# Altium footprint library MainFPs.PcbLib: 215 footprints (part 7 of 14)
Each footprint in its own frame and in the unit in brackets; x right, y up, seen from the top. Pads: shape width x height; smd on the part's side, far side on the other; paste and mask are expansions set on the pad; w line width, h text height; cw(c..) or ccw(c..) is an arc to the next point about the centre after c.
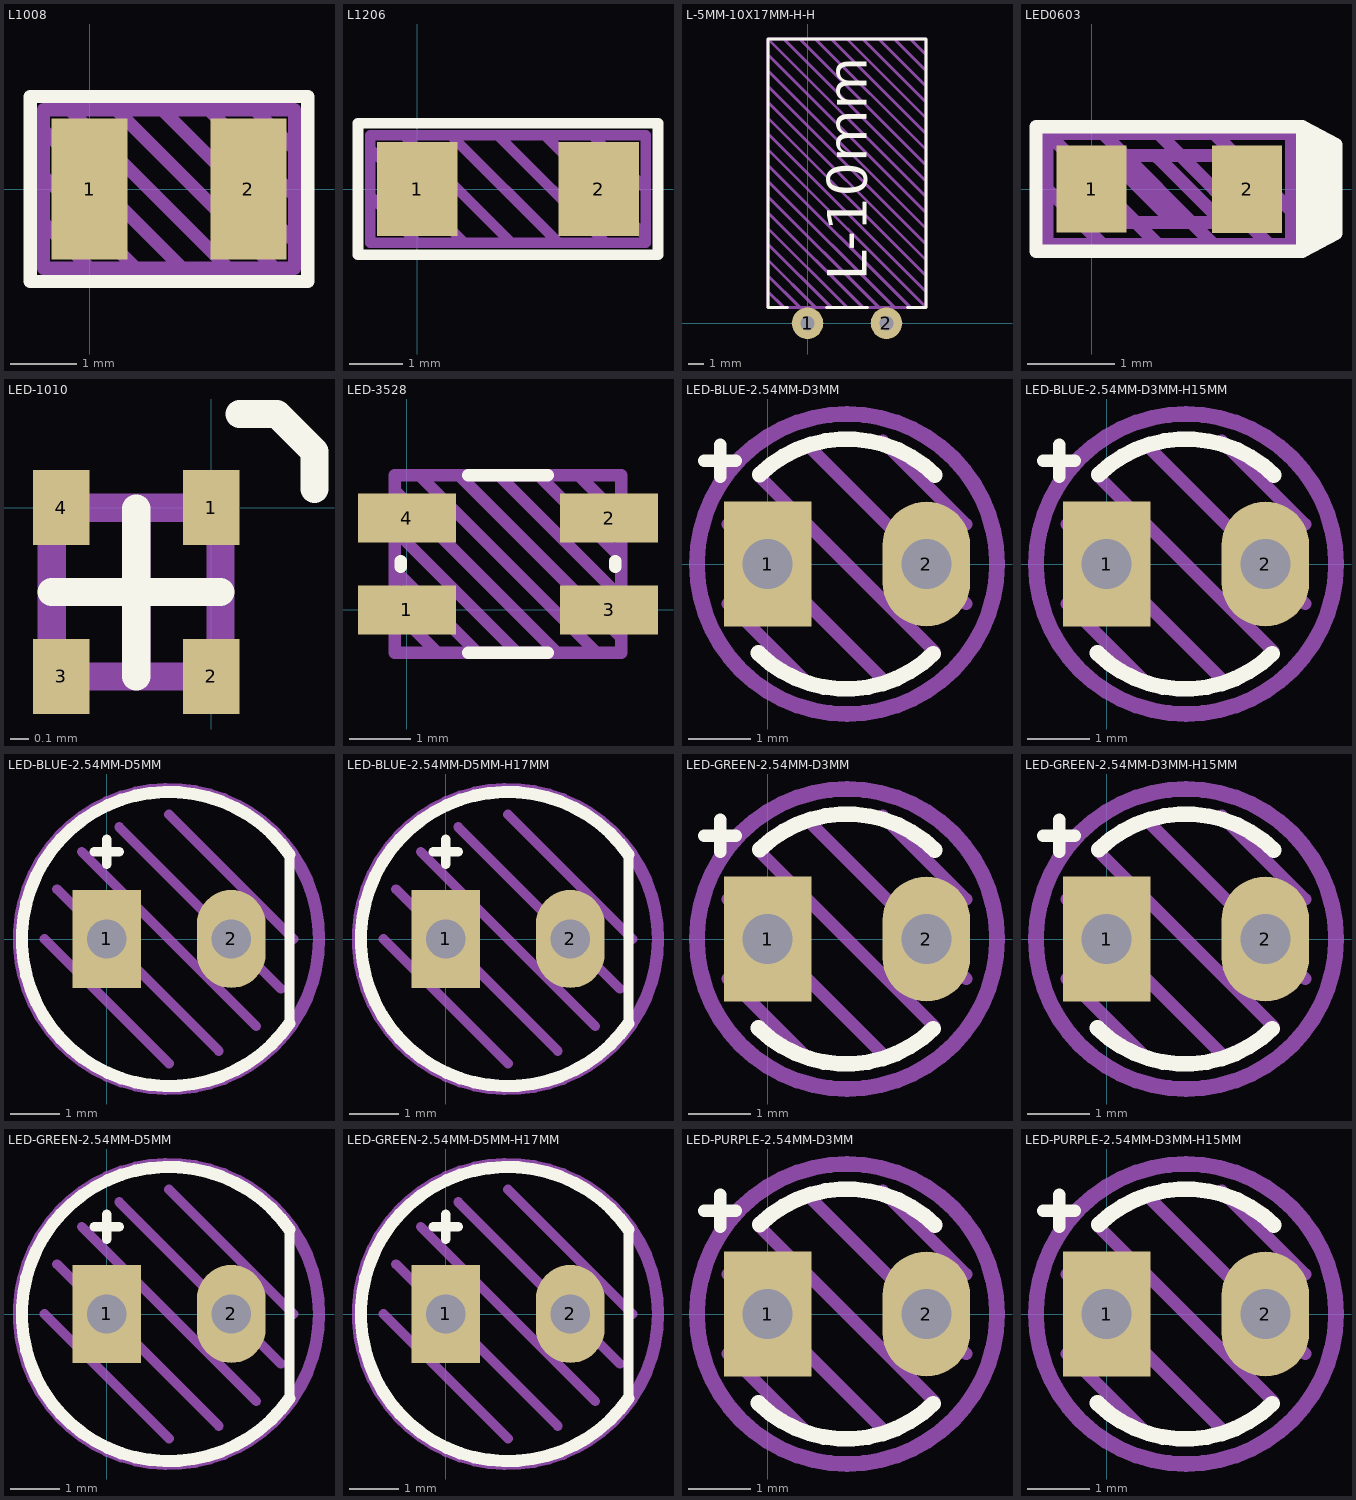
[diagram p6: the footprints below, top view; thin cyan lines are the x and y axes]

## L1008 [mm]
pads (2):
  rect 1.15x2.14 smd: 1(0,0) 2(2.4,0)
Top Overlay:
  lines w0.2: -0.9,-1.4 -0.9,1.4 3.3,1.4 3.3,-1.4 -0.9,-1.4
Top Draw:
  lines w0.2: -0.7,-0.5 0,-1.2 ; -0.7,0.2 0.7,-1.2 ; -0.7,0.9 1.4,-1.2 ; -0.3,1.2 2.1,-1.2 ; 0.4,1.2 2.8,-1.2 ; 1.1,1.2 3.1,-0.8 ; 1.8,1.2 3.1,-0.1 ; 2.5,1.2 3.1,0.6 ; -0.7,-1.2 -0.7,1.2 3.1,1.2 3.1,-1.2 -0.7,-1.2
Top Info:
  text "'.Comment'" at -1.986,-2.537 h0.75
3D body "INDC2520X09N.step": height 0.9, standoff 0, extent -0.05,-1 2.45,1

## L1206 [mil]
pads (2):
  rect 60x70 smd: 1(0,0) 2(135,0)
Top Overlay:
  lines w7.87: -44,-49 -44,49 179,49 179,-49 -44,-49
Top Draw:
  lines w7.87: -35,-5 0,-40 ; -35,30 35,-40 ; -10,40 70,-40 ; 25,40 105,-40 ; 60,40 140,-40 ; 95,40 170,-35 ; 130,40 170,0 ; -35,-40 -35,40 170,40 170,-40 -35,-40
Top Info:
  text "'.Comment'" at -58.52,-95.96 h29.53
3D body "Chip2PinSM127P600-8N.step": height 23.62, standoff 0, extent 5.01,-31.49 131,31.5

## L-5MM-10X17MM-H-H [mm]
pads (2):
  round 2 hole 0.9: 1(0,0) 2(5,0)
Top Overlay:
  lines w0.2: -1.27,1 -2.5,1 -2.5,18 7.5,18 7.5,1 6.35,1 ; 1.2,1 3.8,1
  text "L-10mm" at 3.75,2.7 h2.5
Top Draw:
  lines w0.2: -2.5,2 -1.5,1 ; -2.5,3 -0.5,1 ; -2.5,4 0.5,1 ; -2.5,5 1.5,1 ; -2.5,6 2.5,1 ; -2.5,7 3.5,1 ; -2.5,8 4.5,1 ; -2.5,9 5.5,1 ; -2.5,10 6.5,1 ; -2.5,11 7.5,1 ; -2.5,12 7.5,2 ; -2.5,13 7.5,3 ; -2.5,14 7.5,4 ; -2.5,15 7.5,5 ; -2.5,16 7.5,6 ; -2.5,17 7.5,7 ; -2.5,18 7.5,8 ; -1.5,18 7.5,9 ; -0.5,18 7.5,10 ; 0.5,18 7.5,11 ; 1.5,18 7.5,12 ; 2.5,18 7.5,13 ; 3.5,18 7.5,14 ; 4.5,18 7.5,15 ; 5.5,18 7.5,16 ; 6.5,18 7.5,17 ; 7.5,1 7.5,18 -2.5,18 -2.5,1 7.5,1
Top Info:
  text "'.Comment'" at -4.935,-3.421 h1.75
3D body "L-5.08MM-10X17MM-H-H.stp": height 10.01, standoff -2.6, extent -2.497,-0.25 7.497,18.03

## LED0603 [mm]
pads (2):
  rect 0.8x1 smd: 1(0,0) 2(1.778,0)
Top Overlay:
  region: 2.413,0.711 2.413,-0.711 2.794,-0.508 2.794,0.508
  lines w0.15: 2.413,-0.711 2.794,-0.508 2.794,0.508 2.413,0.711 ; 2.413,-0.711 -0.635,-0.711 -0.635,0.711 2.413,0.711 ; 2.413,-0.711 2.413,0.711
Top Draw:
  lines w0.15: -0.508,0 0.127,-0.635 ; 0.127,0.635 1.397,-0.635 ; 0.761,0.356 1.498,-0.381 ; 0.762,-0.635 -0.508,0.635 ; 0.762,0.635 2.032,-0.635 ; 0.939,-0.381 0.177,0.381 ; 1.397,0.635 2.286,-0.254 ; -0.508,0.635 2.286,0.635 2.286,-0.635 -0.508,-0.635 -0.508,0.635 ; 0.177,0.381 1.498,0.381 1.498,-0.381 ; 0.177,0.381 0.177,-0.381 1.498,-0.381
Top Info:
  text "'.Comment'" at -0.799,-1.333 h0.4
3D body: height 0.11, standoff 0.06, extent 1.552,-0.387 1.702,0.388
3D body: height 0.1, standoff 0, extent -0.073,-0.45 0.426,0.45
3D body: height 0.1, standoff 0, extent 1.352,-0.45 1.851,0.45
3D body: height 0.09, standoff 0.05, extent 0.076,-0.432 1.702,0.432
3D body: height 0.4, standoff 0.09, extent 0.076,-0.432 1.702,0.432
3D body: height 0.15, standoff 0.1, extent 0.677,-0.2 1.077,0.2

## LED-1010 [mm]
pads (4):
  rect 0.3x0.4 smd: 1(0,0) 2(0,-0.9) 3(-0.8,-0.9) 4(-0.8,0)
Top Overlay:
  lines w0.15: -0.85,-0.45 0.05,-0.45 ; -0.4,-0.9 -0.4,-0.004 ; 0.15,0.5 0.35,0.5 0.55,0.3 0.55,0.1
Top Draw:
  lines w0.15: -0.85,-0.45 0.05,-0.45 ; -0.4,-0.9 -0.4,0 ; -0.85,-0.9 -0.85,0 0.05,0 0.05,-0.9 -0.85,-0.9
Top Info:
  text "'.Comment'" at -1.462,-1.546 h0.25
3D body: height 0.17, standoff 0.15, extent -0.21,-0.86 -0.103,-0.82
3D body: height 0.2, standoff 0.15, extent -0.84,-0.38 0.04,-0.001
3D body: height 0.2, standoff 0.15, extent -0.6,-0.496 -0.2,-0.223
3D body: height 0.6, standoff 0.05, extent -0.9,-0.95 0.1,0.05
3D body: height 0.15, standoff 0, extent -0.88,-0.96 -0.6,-0.65
3D body: height 0.15, standoff 0, extent -0.88,-0.25 -0.6,0.06
3D body: height 0.15, standoff 0, extent -0.2,-0.25 0.08,0.06
3D body: height 0.15, standoff 0, extent -0.2,-0.96 0.08,-0.65
3D body: height 0.16, standoff 0.14, extent -0.85,-0.9 0.05,0
3D body: height 0.17, standoff 0.15, extent -0.58,-0.86 -0.2,-0.54

## LED-3528 [mm]
pads (4):
  rect 1.6x0.8 smd: 1(0,0) 2(3.3,1.5) 3(3.3,0) 4(0,1.5)
Top Overlay:
  lines w0.2: -0.1,0.7 -0.1,0.8 ; 1,-0.7 2.3,-0.7 ; 1,2.2 2.3,2.2 ; 3.4,0.7 3.4,0.8
Top Draw:
  lines w0.2: -0.2,0 0.5,-0.7 ; -0.2,0.65 1.15,-0.7 ; -0.2,1.3 1.8,-0.7 ; -0.2,1.95 2.45,-0.7 ; 0.2,2.2 3.1,-0.7 ; 0.85,2.2 3.5,-0.45 ; 1.5,2.2 3.5,0.2 ; 2.15,2.2 3.5,0.85 ; 2.8,2.2 3.5,1.5 ; -0.2,-0.7 -0.2,2.2 3.5,2.2 3.5,-0.7 -0.2,-0.7
Top Info:
  text "'.Comment'" at -1.749,-1.792 h0.8
3D body "LED-3528.stp": height 1.9, standoff 0, extent -0.1,-0.65 3.4,2.15
3D body: height 1.9, standoff 1.89, extent 0.4,-0.5 2.9,2
3D body: height 1.15, standoff 1.1, extent 1.825,0.925 1.975,1.075
3D body: height 1.15, standoff 1.1, extent 1.325,0.925 1.475,1.075
3D body: height 1.15, standoff 1.1, extent 1.825,0.425 1.975,0.575

## LED-BLUE-2.54MM-D3MM [mm]
pads (2):
  rect 1.4x2 hole 0.8: 1(0,0)
  oval 1.4x2 hole 0.8: 2(2.54,0)
Top Overlay:
  lines w0.2: -1.016,1.651 -0.508,1.651 ; -0.762,1.397 -0.762,1.905
  lines w0.25: -0.147,-1.425 ccw(c1.257,-0.001) 2.653,-1.434 ; -0.125,1.433 cw(c1.27,0) 2.674,1.424
Top Draw:
  circle w0.25: c1.27,0 r2.4
  lines w0.2: -0.635,-0.635 0.635,-1.905 ; -0.635,0.635 1.905,-1.905 ; -0.127,1.397 2.667,-1.397 ; 0.635,1.905 3.175,-0.635 ; 1.841,1.968 3.175,0.635
Top Info:
  text "'.Comment'" at -1.705,-3.61 h1
3D body: height 0.5, standoff -3, extent 2.29,-0.25 2.79,0.25
3D body: height 3.7, standoff 1, extent -0.23,-1.5 2.77,1.5
3D body: height 5.3, standoff 2.3, extent -0.236,-1.5 2.764,1.5
3D body: height 0.5, standoff -3, extent -0.25,-0.25 0.25,0.25
3D body: height 1, standoff 0, extent -0.63,-1.91 2.77,1.91

## LED-BLUE-2.54MM-D3MM-H15MM [mm]
pads (2):
  rect 1.4x2 hole 0.8: 1(0,0)
  oval 1.4x2 hole 0.8: 2(2.54,0)
Top Overlay:
  lines w0.2: -1.016,1.651 -0.508,1.651 ; -0.762,1.397 -0.762,1.905
  lines w0.25: -0.147,-1.425 ccw(c1.258,-0.001) 2.653,-1.433 ; -0.125,1.433 cw(c1.27,0) 2.674,1.424
Top Draw:
  circle w0.25: c1.27,0 r2.4
  lines w0.2: -0.635,-0.635 0.635,-1.905 ; -0.635,0.635 1.905,-1.905 ; -0.127,1.397 2.667,-1.397 ; 0.635,1.905 3.175,-0.635 ; 1.842,1.969 3.175,0.635
Top Info:
  text "'.Comment'" at -1.705,-3.61 h1
3D body: height 10, standoff -3, extent 2.29,-0.25 2.79,0.25
3D body: height 13.4, standoff 10.7, extent -0.23,-1.5 2.77,1.5
3D body: height 15, standoff 12, extent -0.236,-1.5 2.764,1.5
3D body: height 10, standoff -3, extent -0.25,-0.25 0.25,0.25
3D body: height 10.7, standoff 9.7, extent -0.63,-1.91 2.77,1.91
3D body: height 7.8, standoff 7, extent -0.3,-0.25 0.3,0.25
3D body: height 7.8, standoff 7, extent 2.24,-0.25 2.84,0.25

## LED-BLUE-2.54MM-D5MM [mm]
pads (2):
  rect 1.4x2 hole 0.8: 1(0,0)
  oval 1.4x2 hole 0.8: 2(2.54,0)
Top Overlay:
  lines w0.2: -0.254,1.778 -0.127,1.778 0.127,1.778 0.254,1.778 ; 0,1.524 0,2.032 ; 3.727,-1.721 3.727,1.721
  lines w0.25: 3.727,-1.721 cw(c1.27,0) 3.727,1.721
Top Draw:
  circle w0.25: c1.27,0 r3.059
  lines w0.2: -1.27,0 1.27,-2.54 ; -1.016,1.016 2.286,-2.286 ; -0.508,1.778 3.048,-1.778 ; 0.254,2.286 3.556,-1.016 ; 1.27,2.54 3.81,0
Top Info:
  text "'.Comment'" at -1.578,-4.372 h1
3D body: height 0.5, standoff -3, extent -0.25,-0.25 0.25,0.25
3D body: height 0.5, standoff -3, extent 2.29,-0.25 2.79,0.25
3D body: height 5.2, standoff 1, extent -1.23,-2.5 3.77,2.5
3D body: height 7.7, standoff 2.7, extent -1.236,-2.5 3.764,2.5
3D body: height 1, standoff 0, extent -1.63,-2.909 3.77,2.909

## LED-BLUE-2.54MM-D5MM-H17MM [mm]
pads (2):
  rect 1.4x2 hole 0.8: 1(0,0)
  oval 1.4x2 hole 0.8: 2(2.54,0)
Top Overlay:
  lines w0.2: -0.254,1.778 -0.127,1.778 0.127,1.778 0.254,1.778 ; 0,1.524 0,2.032 ; 3.727,-1.721 3.727,1.721
  lines w0.25: 3.727,-1.721 cw(c1.27,0) 3.727,1.721
Top Draw:
  circle w0.25: c1.27,0 r3.059
  lines w0.2: -1.27,0 1.27,-2.54 ; -1.016,1.016 2.286,-2.286 ; -0.508,1.778 3.048,-1.778 ; 0.254,2.286 3.556,-1.016 ; 1.27,2.54 3.81,0
Top Info:
  text "'.Comment'" at -1.578,-4.372 h1
3D body: height 10, standoff -3, extent 2.29,-0.25 2.79,0.25
3D body: height 10, standoff -3, extent -0.25,-0.25 0.25,0.25
3D body: height 7.8, standoff 7, extent -0.3,-0.25 0.3,0.25
3D body: height 7.8, standoff 7, extent 2.24,-0.25 2.84,0.25
3D body: height 14.5, standoff 10.3, extent -1.23,-2.5 3.77,2.5
3D body: height 17, standoff 12, extent -1.236,-2.5 3.764,2.5
3D body: height 10.3, standoff 9.3, extent -1.63,-2.909 3.77,2.909

## LED-GREEN-2.54MM-D3MM [mm]
pads (2):
  rect 1.4x2 hole 0.8: 1(0,0)
  oval 1.4x2 hole 0.8: 2(2.54,0)
Top Overlay:
  lines w0.2: -1.016,1.651 -0.508,1.651 ; -0.762,1.397 -0.762,1.905
  lines w0.25: -0.147,-1.425 ccw(c1.257,-0.001) 2.653,-1.434 ; -0.125,1.433 cw(c1.27,0) 2.674,1.424
Top Draw:
  circle w0.25: c1.27,0 r2.4
  lines w0.2: -0.635,-0.635 0.635,-1.905 ; -0.635,0.635 1.905,-1.905 ; -0.127,1.397 2.667,-1.397 ; 0.635,1.905 3.175,-0.635 ; 1.841,1.968 3.175,0.635
Top Info:
  text "'.Comment'" at -1.705,-3.61 h1
3D body: height 0.5, standoff -1.78, extent 2.29,-0.25 2.79,0.25
3D body: height 3.7, standoff 1, extent -0.23,-1.5 2.77,1.5
3D body: height 5.3, standoff 2.3, extent -0.236,-1.5 2.764,1.5
3D body: height 0.5, standoff -1.78, extent -0.25,-0.25 0.25,0.25
3D body: height 1, standoff 0, extent -0.63,-1.91 2.77,1.91

## LED-GREEN-2.54MM-D3MM-H15MM [mm]
pads (2):
  rect 1.4x2 hole 0.8: 1(0,0)
  oval 1.4x2 hole 0.8: 2(2.54,0)
Top Overlay:
  lines w0.2: -1.016,1.651 -0.508,1.651 ; -0.762,1.397 -0.762,1.905
  lines w0.25: -0.147,-1.425 ccw(c1.257,-0.001) 2.653,-1.434 ; -0.125,1.433 cw(c1.27,0) 2.674,1.424
Top Draw:
  circle w0.25: c1.27,0 r2.4
  lines w0.2: -0.635,-0.635 0.635,-1.905 ; -0.635,0.635 1.905,-1.905 ; -0.127,1.397 2.667,-1.397 ; 0.635,1.905 3.175,-0.635 ; 1.841,1.968 3.175,0.635
Top Info:
  text "'.Comment'" at -1.705,-3.61 h1
3D body: height 7.8, standoff 7, extent 2.24,-0.25 2.84,0.25
3D body: height 7.8, standoff 7, extent -0.3,-0.25 0.3,0.25
3D body: height 10.7, standoff 9.7, extent -0.63,-1.91 2.77,1.91
3D body: height 10, standoff -3, extent -0.25,-0.25 0.25,0.25
3D body: height 15, standoff 12, extent -0.236,-1.5 2.764,1.5
3D body: height 13.4, standoff 10.7, extent -0.23,-1.5 2.77,1.5
3D body: height 10, standoff -3, extent 2.29,-0.25 2.79,0.25

## LED-GREEN-2.54MM-D5MM [mm]
pads (2):
  rect 1.4x2 hole 0.8: 1(0,0)
  oval 1.4x2 hole 0.8: 2(2.54,0)
Top Overlay:
  lines w0.2: -0.254,1.778 -0.127,1.778 0.127,1.778 0.254,1.778 ; 0,1.524 0,2.032 ; 3.727,-1.721 3.727,1.721
  lines w0.25: 3.727,-1.721 cw(c1.27,0) 3.727,1.721
Top Draw:
  circle w0.25: c1.27,0 r3.059
  lines w0.2: -1.27,0 1.27,-2.54 ; -1.016,1.016 2.286,-2.286 ; -0.508,1.778 3.048,-1.778 ; 0.254,2.286 3.556,-1.016 ; 1.27,2.54 3.81,0
Top Info:
  text "'.Comment'" at -1.578,-4.372 h1
3D body: height 0.5, standoff -3, extent -0.25,-0.25 0.25,0.25
3D body: height 0.5, standoff -3, extent 2.29,-0.25 2.79,0.25
3D body: height 5.2, standoff 1, extent -1.23,-2.5 3.77,2.5
3D body: height 7.7, standoff 2.7, extent -1.236,-2.5 3.764,2.5
3D body: height 1, standoff 0, extent -1.63,-2.909 3.77,2.909

## LED-GREEN-2.54MM-D5MM-H17MM [mm]
pads (2):
  rect 1.4x2 hole 0.8: 1(0,0)
  oval 1.4x2 hole 0.8: 2(2.54,0)
Top Overlay:
  lines w0.2: -0.254,1.778 -0.127,1.778 0.127,1.778 0.254,1.778 ; 0,1.524 0,2.032 ; 3.727,-1.721 3.727,1.721
  lines w0.25: 3.727,-1.721 cw(c1.27,0) 3.727,1.721
Top Draw:
  circle w0.25: c1.27,0 r3.059
  lines w0.2: -1.27,0 1.27,-2.54 ; -1.016,1.016 2.286,-2.286 ; -0.508,1.778 3.048,-1.778 ; 0.254,2.286 3.556,-1.016 ; 1.27,2.54 3.81,0
Top Info:
  text "'.Comment'" at -1.578,-4.372 h1
3D body: height 10.3, standoff 9.3, extent -1.63,-2.909 3.77,2.909
3D body: height 17, standoff 12, extent -1.236,-2.5 3.764,2.5
3D body: height 14.5, standoff 10.3, extent -1.23,-2.5 3.77,2.5
3D body: height 7.8, standoff 7, extent 2.24,-0.25 2.84,0.25
3D body: height 7.8, standoff 7, extent -0.3,-0.25 0.3,0.25
3D body: height 10, standoff -3, extent -0.25,-0.25 0.25,0.25
3D body: height 10, standoff -3, extent 2.29,-0.25 2.79,0.25

## LED-PURPLE-2.54MM-D3MM [mm]
pads (2):
  rect 1.4x2 hole 0.8: 1(0,0)
  oval 1.4x2 hole 0.8: 2(2.54,0)
Top Overlay:
  lines w0.2: -1.016,1.651 -0.508,1.651 ; -0.762,1.397 -0.762,1.905
  lines w0.25: -0.147,-1.425 ccw(c1.257,-0.001) 2.653,-1.434 ; -0.125,1.433 cw(c1.27,0) 2.674,1.424
Top Draw:
  circle w0.25: c1.27,0 r2.4
  lines w0.2: -0.635,-0.635 0.635,-1.905 ; -0.635,0.635 1.905,-1.905 ; -0.127,1.397 2.667,-1.397 ; 0.635,1.905 3.175,-0.635 ; 1.841,1.968 3.175,0.635
Top Info:
  text "'.Comment'" at -1.705,-3.61 h1
3D body: height 0.5, standoff -1.78, extent 2.29,-0.25 2.79,0.25
3D body: height 3.7, standoff 1, extent -0.23,-1.5 2.77,1.5
3D body: height 5.3, standoff 2.3, extent -0.236,-1.5 2.764,1.5
3D body: height 0.5, standoff -1.78, extent -0.25,-0.25 0.25,0.25
3D body: height 1, standoff 0, extent -0.63,-1.91 2.77,1.91

## LED-PURPLE-2.54MM-D3MM-H15MM [mm]
pads (2):
  rect 1.4x2 hole 0.8: 1(0,0)
  oval 1.4x2 hole 0.8: 2(2.54,0)
Top Overlay:
  lines w0.2: -1.016,1.651 -0.508,1.651 ; -0.762,1.397 -0.762,1.905
  lines w0.25: -0.147,-1.425 ccw(c1.257,-0.001) 2.653,-1.434 ; -0.125,1.433 cw(c1.27,0) 2.674,1.424
Top Draw:
  circle w0.25: c1.27,0 r2.4
  lines w0.2: -0.635,-0.635 0.635,-1.905 ; -0.635,0.635 1.905,-1.905 ; -0.127,1.397 2.667,-1.397 ; 0.635,1.905 3.175,-0.635 ; 1.841,1.968 3.175,0.635
Top Info:
  text "'.Comment'" at -1.705,-3.61 h1
3D body: height 10, standoff -3, extent 2.29,-0.25 2.79,0.25
3D body: height 13.4, standoff 10.7, extent -0.23,-1.5 2.77,1.5
3D body: height 15, standoff 12, extent -0.236,-1.5 2.764,1.5
3D body: height 10, standoff -3, extent -0.25,-0.25 0.25,0.25
3D body: height 10.7, standoff 9.7, extent -0.63,-1.91 2.77,1.91
3D body: height 7.8, standoff 7, extent -0.3,-0.25 0.3,0.25
3D body: height 7.8, standoff 7, extent 2.24,-0.25 2.84,0.25